# Altium footprint library hallglib.PcbLib: 106 footprints (part 5 of 7)
Each footprint in its own frame and in the unit in brackets; x right, y up, seen from the top. Pads: shape width x height; smd on the part's side, far side on the other; paste and mask are expansions set on the pad; w line width, h text height; cw(c..) or ccw(c..) is an arc to the next point about the centre after c.
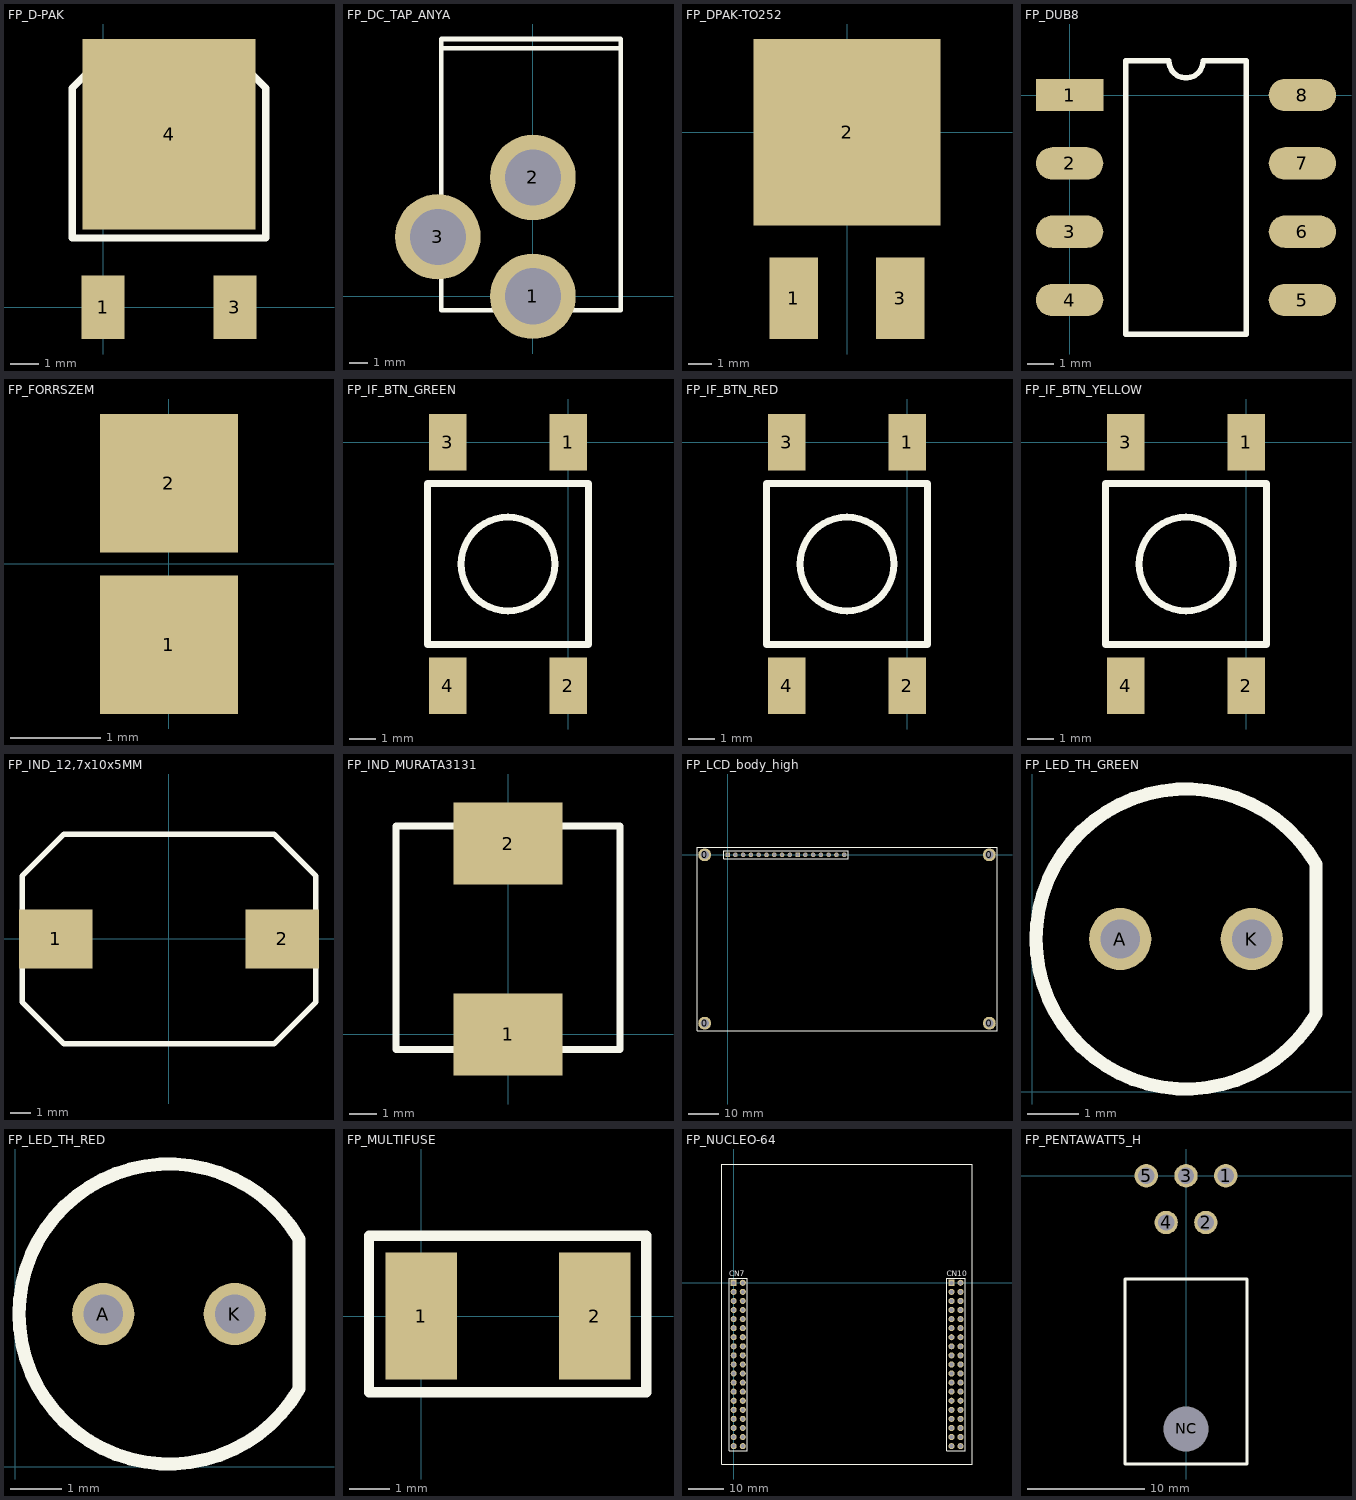
[diagram p4: the footprints below, top view; thin cyan lines are the x and y axes]

## FP_D-PAK [mm] "D-Pak (TO-252-AA)"
height 2.39
pads (3):
  rect 1.5x2.2 smd: 1(0,0) 3(4.572,0)
  rect 6x6.6 smd: 4(2.286,6)
Top Overlay:
  lines w0.254: -1.064,2.404 -1.064,7.604 -0.064,8.604 4.636,8.604 5.636,7.604 5.636,2.404 -1.064,2.404
3D body "D-PAK_TO252AA.STEP": height 2.32, standoff 0.02, extent -0.992,-0.786 5.588,8.914

## FP_DC_TAP_ANYA [mil] "DC HEBA25 TÁPFESZÜLTSÉG ALJZAT ZÁRT, NYÁKBA 90°"
height 421.26
pads (3):
  round 180 hole 118: 1(0,0) 2(0,250) 3(-200,125)
Top Overlay:
  lines w10: -192.91,522.13 185.04,522.13 ; -192.91,-29.53 -192.91,541.34 185.04,541.34 185.04,-29.53 -192.91,-29.53
3D body "kycon kld-0202-a.step": height 440, standoff -141.73, extent -190.39,-30.63 182.52,539.37

## FP_DPAK-TO252 [mm] "D-PAK Package"
height 2.18
pads (3):
  rect 2.08x3.5 smd: 1(-2.286,-7.112) 3(2.286,-7.112)
  rect 8x8 smd: 2(0,0)
3D body "DPAK_TO-252AA.STEP": height 2.37, standoff -0.03, extent -3.367,-7.112 3.367,2.988

## FP_DUB8 [mm] "DUB 8 tokozás (TI ISO1050)"
height 4.85
pads (8):
  rect 2.5x1.2 smd: 1(0,0)
  oval 2.5x1.2 smd: 2(0,-2.54) 3(0,-5.08) 4(0,-7.62) 5(8.65,-7.62) 6(8.65,-5.08) 7(8.65,-2.54) 8(8.65,0)
Top Overlay:
  lines w0.2: 2.085,-8.89 6.565,-8.89 6.565,1.27 4.96,1.27 cw(c4.325,1.27) 3.69,1.27 2.085,1.27 2.085,-8.89
3D body "8-DUB_legs.STEP": height 2.68, standoff 0, extent -0.9,-7.964 9.6,0.164
3D body "8-DUB_body.STEP": height 4.2, standoff 0.9, extent 1,-8.65 7.62,0.85

## FP_FORRSZEM [mil]
pads (2):
  rect 60x60 smd mask+5: 1(0,-35) 2(0,35)
3D body: height 20, standoff -40, extent -29.68,-29.87 30,29.88

## FP_IF_BTN_GREEN [mm] "OMRON ELECTRONIC COMPONENTS - B3FS-1050 - SWITCH, SPNO, EXTENDED"
height 7.3
pads (4):
  rect 1.4x2.1 smd: 1(0,0) 2(0,-9.1) 3(-4.5,0) 4(-4.5,-9.1)
Top Overlay:
  circle w0.254: c-2.25,-4.55 r1.75
  lines w0.254: -5.25,-7.55 -5.25,-1.55 0.75,-1.55 0.75,-7.55 -5.25,-7.55
3D body: height 7.3, standoff 5.5, extent -3.445,-5.745 -1.055,-3.35
3D body: height 5.5, standoff 3.1, extent -3.146,-5.446 -1.354,-3.65
3D body: height 3.1, standoff 2.6, extent -3.55,-5.847 -0.96,-3.253
3D body: height 2.6, standoff 0, extent -5.4,-7.55 0.95,-1.55
3D body: height 8, standoff 4.5, extent -4.25,-6.5 -0.25,-2.5
3D body: height 9, standoff 8, extent -4.25,-6.5 -0.25,-2.5
3D body: height 10, standoff 9, extent -4.25,-6.5 -0.25,-2.5

## FP_IF_BTN_RED [mm] "OMRON ELECTRONIC COMPONENTS - B3FS-1050 - SWITCH, SPNO, EXTENDED"
height 7.3
pads (4):
  rect 1.4x2.1 smd: 1(0,0) 2(0,-9.1) 3(-4.5,0) 4(-4.5,-9.1)
Top Overlay:
  circle w0.254: c-2.25,-4.55 r1.75
  lines w0.254: -5.25,-7.55 -5.25,-1.55 0.75,-1.55 0.75,-7.55 -5.25,-7.55
3D body: height 7.3, standoff 5.5, extent -3.445,-5.745 -1.055,-3.35
3D body: height 5.5, standoff 3.1, extent -3.146,-5.446 -1.354,-3.65
3D body: height 3.1, standoff 2.6, extent -3.55,-5.847 -0.96,-3.253
3D body: height 2.6, standoff 0, extent -5.4,-7.55 0.95,-1.55
3D body: height 8, standoff 4.5, extent -4.25,-6.5 -0.25,-2.5
3D body: height 9, standoff 8, extent -4.25,-6.5 -0.25,-2.5
3D body: height 10, standoff 9, extent -4.25,-6.5 -0.25,-2.5

## FP_IF_BTN_YELLOW [mm] "OMRON ELECTRONIC COMPONENTS - B3FS-1050 - SWITCH, SPNO, EXTENDED"
height 7.3
pads (4):
  rect 1.4x2.1 smd: 1(0,0) 2(0,-9.1) 3(-4.5,0) 4(-4.5,-9.1)
Top Overlay:
  circle w0.254: c-2.25,-4.55 r1.75
  lines w0.254: -5.25,-7.55 -5.25,-1.55 0.75,-1.55 0.75,-7.55 -5.25,-7.55
3D body: height 7.3, standoff 5.5, extent -3.445,-5.745 -1.055,-3.35
3D body: height 5.5, standoff 3.1, extent -3.146,-5.446 -1.354,-3.65
3D body: height 3.1, standoff 2.6, extent -3.55,-5.847 -0.96,-3.253
3D body: height 2.6, standoff 0, extent -5.4,-7.55 0.95,-1.55
3D body: height 8, standoff 4.5, extent -4.25,-6.5 -0.25,-2.5
3D body: height 9, standoff 8, extent -4.25,-6.5 -0.25,-2.5
3D body: height 10, standoff 9, extent -4.25,-6.5 -0.25,-2.5

## FP_IND_12,7x10x5MM [mm] "Induktivitás"
height 5
pads (2):
  rect 3.5x2.8 smd: 1(-5.4,0) 2(5.4,0)
Top Overlay:
  lines w0.254: -4,-5 4,-5 ; -4,-5 -4,-5 ; -4,-5 -5,-5 -7,-3 -7,-1.6 -7,1.6 -7,3 -5,5 -4,5 ; -4,5 4,5 ; -4,5 -4,5 ; 4,-5 4,-5 ; 4,-5 5,-5 7,-3 7,-1.6 7,1.6 7,3 5,5 4,5 ; 4,5 4,5
3D body: height 4.5, standoff 1, extent -3.671,-3.693 3.7,3.693
3D body: height 1, standoff 0, extent -6.35,-5.08 6.35,5.08
3D body: height 5, standoff 4.5, extent -4.216,-4.241 4.25,4.242

## FP_IND_MURATA3131 [mm] "Murata Chip Inductor LQH88P Series (3131 Size)"
height 4
pads (2):
  rect 4x3 smd: 1(0,0) 2(0,7)
Top Overlay:
  lines w0.254: -4.1,-0.55 -4.1,7.65 4.1,7.65 4.1,-0.55 -4.1,-0.55
3D body: height 1, standoff 0, extent -4,-0.5 4,7.6
3D body: height 3.8, standoff 2.8, extent -4,-0.5 4,7.6
3D body: height 2.8, standoff 1, extent -3.572,-0.043 3.6,7.143
3D body: height 0.3, standoff 0, extent -1.4,-0.55 1.4,-0.5
3D body: height 0.3, standoff 0, extent -1.4,7.6 1.4,7.65

## FP_LCD_body_high [mm]
pads (20):
  round 4.2 hole 2.7: 0(-7.5,-55) 0(-7.5,0) 0(85.5,-55) 0(85.5,0)
  rect 1.5x1.5 hole 1.1: 1(0,0) 10(22.86,0)
  round 1.5 hole 1.1: 2(2.54,0) 3(5.08,0) 4(7.62,0) 5(10.16,0) 6(12.7,0) 7(15.24,0) 8(17.78,0) 9(20.32,0) 11(25.4,0) 12(27.94,0) 13(30.48,0) 14(33.02,0) 15(35.56,0) 16(38.1,0)
Top Overlay:
  lines w0.254: -10,-57.5 88,-57.5 88,2.5 -10,2.5 -10,-57.5 ; -1.27,-1.27 39.37,-1.27 39.37,1.27 -1.27,1.27 -1.27,-1.27
3D body: height 9.95, standoff 9.9, extent 71.25,-38.9 74.2,-34.15
3D body: height 9.95, standoff 9.9, extent 71.25,-33.55 74.2,-28.8
3D body: height 9.95, standoff 9.9, extent 71.25,-28.2 74.2,-23.45
3D body: height 9.95, standoff 9.9, extent 71.25,-22.85 74.2,-18.1
3D body: height 9.95, standoff 9.9, extent 67.7,-38.9 70.65,-34.15
3D body: height 9.95, standoff 9.9, extent 67.7,-33.55 70.65,-28.8
3D body: height 9.95, standoff 9.9, extent 67.7,-28.2 70.65,-23.45
3D body: height 9.95, standoff 9.9, extent 67.7,-22.85 70.65,-18.1
3D body: height 9.95, standoff 9.9, extent 64.15,-38.9 67.1,-34.15
3D body: height 9.95, standoff 9.9, extent 64.15,-33.55 67.1,-28.8
3D body: height 9.95, standoff 9.9, extent 64.15,-28.2 67.1,-23.45
3D body: height 9.95, standoff 9.9, extent 64.15,-22.85 67.1,-18.1
3D body: height 9.95, standoff 9.9, extent 60.6,-38.9 63.55,-34.15
3D body: height 9.95, standoff 9.9, extent 60.6,-33.55 63.55,-28.8
3D body: height 9.95, standoff 9.9, extent 60.6,-28.2 63.55,-23.45
3D body: height 9.95, standoff 9.9, extent 60.6,-22.85 63.55,-18.1
3D body: height 9.95, standoff 9.9, extent 57.05,-38.9 60,-34.15
3D body: height 9.95, standoff 9.9, extent 57.05,-33.55 60,-28.8
3D body: height 9.95, standoff 9.9, extent 57.05,-28.2 60,-23.45
3D body: height 9.95, standoff 9.9, extent 57.05,-22.85 60,-18.1
3D body: height 9.95, standoff 9.9, extent 53.5,-38.9 56.45,-34.15
3D body: height 9.95, standoff 9.9, extent 53.5,-33.55 56.45,-28.8
3D body: height 9.95, standoff 9.9, extent 53.5,-28.2 56.45,-23.45
3D body: height 9.95, standoff 9.9, extent 53.5,-22.85 56.45,-18.1
3D body: height 9.95, standoff 9.9, extent 49.95,-38.9 52.9,-34.15
3D body: height 9.95, standoff 9.9, extent 49.95,-33.55 52.9,-28.8
3D body: height 9.95, standoff 9.9, extent 49.95,-28.2 52.9,-23.45
3D body: height 9.95, standoff 9.9, extent 49.95,-22.85 52.9,-18.1
3D body: height 9.95, standoff 9.9, extent 46.4,-38.9 49.35,-34.15
3D body: height 9.95, standoff 9.9, extent 46.4,-33.55 49.35,-28.8
3D body: height 9.95, standoff 9.9, extent 46.4,-28.2 49.35,-23.45
3D body: height 9.95, standoff 9.9, extent 46.4,-22.85 49.35,-18.1
3D body: height 9.95, standoff 9.9, extent 42.85,-38.9 45.8,-34.15
3D body: height 9.95, standoff 9.9, extent 42.85,-33.55 45.8,-28.8
3D body: height 9.95, standoff 9.9, extent 42.85,-28.2 45.8,-23.45
3D body: height 9.95, standoff 9.9, extent 42.85,-22.85 45.8,-18.1
3D body: height 9.95, standoff 9.9, extent 39.3,-38.9 42.25,-34.15
3D body: height 9.95, standoff 9.9, extent 39.3,-33.55 42.25,-28.8
3D body: height 9.95, standoff 9.9, extent 39.3,-28.2 42.25,-23.45
3D body: height 9.95, standoff 9.9, extent 39.3,-22.85 42.25,-18.1
3D body: height 9.95, standoff 9.9, extent 35.75,-38.9 38.7,-34.15
3D body: height 9.95, standoff 9.9, extent 35.75,-33.55 38.7,-28.8
3D body: height 9.95, standoff 9.9, extent 35.75,-28.2 38.7,-23.45
3D body: height 9.95, standoff 9.9, extent 35.75,-22.85 38.7,-18.1
3D body: height 9.95, standoff 9.9, extent 32.2,-38.9 35.15,-34.15
3D body: height 9.95, standoff 9.9, extent 32.2,-33.55 35.15,-28.8
3D body: height 9.95, standoff 9.9, extent 32.2,-28.2 35.15,-23.45
3D body: height 9.95, standoff 9.9, extent 32.2,-22.85 35.15,-18.1
3D body: height 9.95, standoff 9.9, extent 28.65,-38.9 31.6,-34.15
3D body: height 9.95, standoff 9.9, extent 28.65,-33.55 31.6,-28.8
3D body: height 9.95, standoff 9.9, extent 28.65,-28.2 31.6,-23.45
3D body: height 9.95, standoff 9.9, extent 28.65,-22.85 31.6,-18.1
3D body: height 9.95, standoff 9.9, extent 25.1,-38.9 28.05,-34.15
3D body: height 9.95, standoff 9.9, extent 25.1,-33.55 28.05,-28.8
3D body: height 9.95, standoff 9.9, extent 25.1,-28.2 28.05,-23.45
3D body: height 9.95, standoff 9.9, extent 25.1,-22.85 28.05,-18.1
3D body: height 9.95, standoff 9.9, extent 21.55,-38.9 24.5,-34.15
3D body: height 9.95, standoff 9.9, extent 21.55,-33.55 24.5,-28.8
3D body: height 9.95, standoff 9.9, extent 21.55,-28.2 24.5,-23.45
3D body: height 9.95, standoff 9.9, extent 21.55,-22.85 24.5,-18.1
3D body: height 9.95, standoff 9.9, extent 18,-38.9 20.95,-34.15
3D body: height 9.95, standoff 9.9, extent 18,-33.55 20.95,-28.8
3D body: height 9.95, standoff 9.9, extent 18,-28.2 20.95,-23.45
3D body: height 9.95, standoff 9.9, extent 18,-22.85 20.95,-18.1
3D body: height 9.95, standoff 9.9, extent 14.45,-38.9 17.4,-34.15
3D body: height 9.95, standoff 9.9, extent 14.45,-33.55 17.4,-28.8
3D body: height 9.95, standoff 9.9, extent 14.45,-28.2 17.4,-23.45
3D body: height 9.95, standoff 9.9, extent 14.45,-22.85 17.4,-18.1
3D body: height 9.95, standoff 9.9, extent 10.9,-38.9 13.85,-34.15
3D body: height 9.95, standoff 9.9, extent 10.9,-33.55 13.85,-28.8
3D body: height 9.95, standoff 9.9, extent 10.9,-28.2 13.85,-23.45
3D body: height 9.95, standoff 9.9, extent 10.9,-22.85 13.85,-18.1
3D body: height 9.95, standoff 9.9, extent 7.35,-38.9 10.3,-34.15
3D body: height 9.95, standoff 9.9, extent 7.35,-33.55 10.3,-28.8
3D body: height 9.95, standoff 9.9, extent 7.35,-28.2 10.3,-23.45
3D body: height 9.95, standoff 9.9, extent 7.35,-22.85 10.3,-18.1
3D body: height 9.95, standoff 9.9, extent 3.8,-38.9 6.75,-34.15
3D body: height 9.95, standoff 9.9, extent 3.8,-33.55 6.75,-28.8
3D body: height 9.95, standoff 9.9, extent 3.8,-28.2 6.75,-23.45
3D body: height 9.95, standoff 9.9, extent 3.8,-22.85 6.75,-18.1
3D body: height 10, standoff 5, extent 1,-41.1 77,-15.9
3D body: height 10, standoff 5, extent 77,-49.5 88,-7.5
3D body: height 10, standoff 5, extent 1,-49.5 77,-41.1
3D body: height 10, standoff 5, extent 1,-15.9 77,-7.5
3D body: height 10, standoff 5, extent -10,-49.5 1,-7.5
3D body: height 5.05, standoff 3.35, extent -8.75,-56.248 -6.26,-53.752
3D body: height 5.05, standoff 3.35, extent -8.75,-1.248 -6.26,1.248
3D body: height 5.05, standoff 3.35, extent 84.25,-1.248 86.74,1.248
3D body: height 5.05, standoff 3.35, extent 84.25,-56.248 86.74,-53.752
3D body: height 5.05, standoff 3.35, extent -0.55,-0.548 0.546,0.55
3D body: height 5.05, standoff 3.35, extent 1.99,-0.548 3.086,0.55
3D body: height 5.05, standoff 3.35, extent 4.53,-0.548 5.626,0.55
3D body: height 5.05, standoff 3.35, extent 7.07,-0.548 8.166,0.55
3D body: height 5.05, standoff 3.35, extent 9.61,-0.548 10.706,0.55
3D body: height 5.05, standoff 3.35, extent 12.15,-0.548 13.246,0.55
3D body: height 5.05, standoff 3.35, extent 14.69,-0.548 15.786,0.55
3D body: height 5.05, standoff 3.35, extent 17.23,-0.548 18.326,0.55
3D body: height 5.05, standoff 3.35, extent 19.77,-0.548 20.866,0.55
3D body: height 5.05, standoff 3.35, extent 22.31,-0.548 23.406,0.55
3D body: height 5.05, standoff 3.35, extent 24.85,-0.548 25.946,0.55
3D body: height 5.05, standoff 3.35, extent 27.39,-0.548 28.486,0.55
3D body: height 5.05, standoff 3.35, extent 29.93,-0.548 31.026,0.55
3D body: height 5.05, standoff 3.35, extent 32.47,-0.548 33.566,0.55
3D body: height 5.05, standoff 3.35, extent 35.01,-0.548 36.106,0.55
3D body: height 5.05, standoff 3.35, extent 37.55,-0.548 38.646,0.55
3D body: height 5, standoff 0.4, extent -6,-11 84,-10
3D body: height 5, standoff 0.4, extent -6,-46.95 84,-45.95
3D body: height 5, standoff 3.4, extent -10,-57.5 88,2.5

## FP_LED_TH_GREEN [mm]
pads (2):
  round 1.2 hole 0.762: A(1.7,2.95) K(4.24,2.95)
Top Overlay:
  lines w0.254: 5.478,1.502 cw(c2.97,2.95) 5.478,4.398 5.478,1.502
3D body "corto_green.step": height 10.25, standoff -5, extent 0,0 5.45,5.9

## FP_LED_TH_RED [mm]
pads (2):
  round 1.2 hole 0.762: A(1.7,2.95) K(4.24,2.95)
Top Overlay:
  lines w0.254: 5.478,1.502 cw(c2.97,2.95) 5.478,4.398 5.478,1.502
3D body "corto_red.step": height 10.25, standoff -5, extent 0,0 5.45,5.9

## FP_MULTIFUSE [mm] "POLYFUSE SMD 1812"
height 1
pads (2):
  rect 1.78x3.15 smd: 1(0,0) 2(4.318,0)
Top Overlay:
  lines w0.254: -1.3,-1.9 -1.3,2 5.6,2 5.6,-1.9 -1.3,-1.9
3D body: height 1, standoff 0, extent -0.126,-1.65 4.571,1.777

## FP_NUCLEO-64 [mm]
height 11
pads (76):
  rect 1.7x1.7 hole 1.1: 1(0,0) 39(60.96,0)
  round 1.7 hole 1.1: 2(2.54,0) 3(0,-2.54) 4(2.54,-2.54) 5(0,-5.08) 6(2.54,-5.08) 7(0,-7.62) 8(2.54,-7.62) 9(0,-10.16) 10(2.54,-10.16) 11(0,-12.7) 12(2.54,-12.7) 13(0,-15.24) 14(2.54,-15.24) 15(0,-17.78) 16(2.54,-17.78) 17(0,-20.32) 18(2.54,-20.32) 19(0,-22.86) 20(2.54,-22.86) 21(0,-25.4) 22(2.54,-25.4) 23(0,-27.94) 24(2.54,-27.94) 25(0,-30.48) 26(2.54,-30.48) 27(0,-33.02) 28(2.54,-33.02) 29(0,-35.56) 30(2.54,-35.56) 31(0,-38.1) 32(2.54,-38.1) 33(0,-40.64) 34(2.54,-40.64) 35(0,-43.18) 36(2.54,-43.18) 37(0,-45.72) 38(2.54,-45.72) 40(63.5,0) 41(60.96,-2.54) 42(63.5,-2.54) 43(60.96,-5.08) 44(63.5,-5.08) 45(60.96,-7.62) 46(63.5,-7.62) 47(60.96,-10.16) 48(63.5,-10.16) 49(60.96,-12.7) 50(63.5,-12.7) 51(60.96,-15.24) 52(63.5,-15.24) 53(60.96,-17.78) 54(63.5,-17.78) 55(60.96,-20.32) 56(63.5,-20.32) 57(60.96,-22.86) 58(63.5,-22.86) 59(60.96,-25.4) 60(63.5,-25.4) 61(60.96,-27.94) 62(63.5,-27.94) 63(60.96,-30.48) 64(63.5,-30.48) 65(60.96,-33.02) 66(63.5,-33.02) 67(60.96,-35.56) 68(63.5,-35.56) 69(60.96,-38.1) 70(63.5,-38.1) 71(60.96,-40.64) 72(63.5,-40.64) 73(60.96,-43.18) 74(63.5,-43.18) 75(60.96,-45.72) 76(63.5,-45.72)
Top Overlay:
  lines w0.2: -1.27,-46.99 3.81,-46.99 3.81,1.27 -1.27,1.27 -1.27,-46.99 ; 59.69,-46.99 64.77,-46.99 64.77,1.27 59.69,1.27 59.69,-46.99
  lines w0.254: -3.3,-50.725 -3.3,33.25 66.725,33.25 66.725,-50.725 -3.3,-50.725
  text "CN10" at 59.69,1.778 h1.52
  text "CN7" at -1.27,1.778 h1.52
3D body: height 10, standoff 0, extent 59.691,-46.989 64.769,1.269
3D body: height 10, standoff 0, extent -1.269,-46.989 3.809,1.269
3D body: height 11, standoff 10, extent -3.299,-50.724 66.724,33.249

## FP_PENTAWATT5_H [mm] "Pentawatt 5 lead trough hole, horisontal mount"
height 4.8
pads (6):
  round 2 hole 1.4: 1(3.4,0) 2(1.7,-4) 3(0,0) 4(-1.7,-4) 5(-3.4,0)
  round 2 hole 3.85: NC(0,-21.65)
Top Overlay:
  lines w0.254: -5.2,-24.65 -5.2,-8.85 5.2,-8.85 5.2,-24.65 -5.2,-24.65
3D body "PENTAWATT5-HOROZONTAL.STEP": height 4.5, standoff -5.4, extent -5.2,-21.782 5.2,0.268